# Altium footprint library Generic Footprint.PcbLib: 160 footprints (part 12 of 20) (continued)
## Symbol_CE-Logo-15x10mm_Silkscreen [mil] (continued)
1(453.22,392.68) 1(454.41,180.08) 1(455,96.81) 1(455,97.4) 1(455,97.99) 1(455,180.08) 1(455,321.22) 1(455,321.81) 1(455,322.4) 1(455,392.68) 1(455.59,25.94) 1(455.59,26.54) 1(455.59,322.99) 1(455.59,392.68) 1(455.59,393.27) 1(456.18,25.35) 1(456.18,322.99) 1(456.18,393.86) 1(456.18,394.45) 1(456.77,180.08) 1(456.77,322.99) 1(456.77,323.58) 1(456.77,324.17) 1(457.36,324.76) 1(457.95,180.08) 1(458.54,95.63) 1(458.54,96.22) 1(459.13,24.17) 1(459.13,24.76) 1(459.13,95.04) 1(459.13,395.04) 1(459.72,395.63) 1(459.72,396.22) 1(460.31,23.58) 1(460.31,94.45) 1(460.31,325.35) 1(460.9,93.27) 1(460.9,93.86) 1(460.9,325.94) 1(460.9,326.54) 1(461.49,22.99) 1(462.08,22.99) 1(462.67,22.99) 1(462.67,90.91) 1(462.67,91.5) 1(462.67,92.09) 1(462.67,92.68) 1(462.67,327.13) 1(462.67,327.72) 1(462.67,328.31) 1(463.26,22.4) 1(463.26,328.9) 1(463.26,396.81) 1(463.26,397.4) 1(463.85,21.81) 1(463.85,328.9) 1(463.85,397.99) 1(464.44,328.9) 1(464.44,329.49) 1(464.44,330.08) 1(465.04,21.22) 1(465.04,330.67) 1(465.63,330.67) 1(466.22,89.72) 1(466.22,90.31) 1(466.81,89.13) 1(466.81,398.58) 1(467.4,399.17) 1(467.99,330.67) 1(467.99,331.85) 1(467.99,399.76) 1(467.99,400.35) 1(468.58,19.45) 1(468.58,20.04) 1(468.58,20.63) 1(468.58,87.36) 1(468.58,87.95) 1(468.58,88.54) 1(468.58,331.26) 1(468.58,332.44) 1(468.58,400.35) 1(469.17,19.45) 1(469.17,332.44) 1(469.76,19.45) 1(470.35,332.44) 1(470.35,333.03) 1(470.35,333.62) 1(470.35,334.21) 1(471.53,86.77) 1(472.12,85.59) 1(472.12,86.18) 1(472.12,400.35) 1(472.71,18.27) 1(472.71,18.86) 1(472.71,400.94) 1(472.71,401.54) 1(473.3,17.68) 1(473.89,334.8) 1(473.89,335.39) 1(473.89,335.98) 1(473.89,402.13) 1(474.48,85) 1(475.67,84.41) 1(476.26,83.82) 1(476.85,83.23) 1(476.85,402.72) 1(476.85,403.31) 1(477.44,83.23) 1(477.44,336.57) 1(478.03,17.09) 1(478.03,81.46) 1(478.03,82.05) 1(478.03,82.64) 1(478.03,83.23) 1(478.03,337.17) 1(478.03,337.76) 1(478.03,338.35) 1(478.03,403.9) 1(478.62,15.91) 1(478.62,16.5) 1(478.62,338.35) 1(479.8,338.35) 1(481.57,79.68) 1(481.57,80.28) 1(481.57,80.87) 1(481.57,338.94) 1(481.57,339.53) 1(482.16,404.49) 1(482.16,405.08) 1(482.75,340.12) 1(482.75,405.67) 1(483.93,14.13) 1(483.93,14.72) 1(483.93,15.31) 1(484.52,340.71) 1(485.7,13.54) 1(485.7,77.91) 1(485.7,78.5) 1(485.7,79.09) 1(485.7,341.3) 1(486.29,341.89) 1(487.48,406.26) 1(487.48,406.85) 1(488.07,77.32) 1(488.66,77.32) 1(488.66,180.08) 1(488.66,407.44) 1(489.25,76.14) 1(489.25,76.73) 1(489.25,77.32) 1(489.25,180.08) 1(489.25,342.48) 1(489.25,343.07) 1(489.84,12.36) 1(489.84,12.95) 1(489.84,343.66) 1(491.61,180.08) 1(492.2,11.77) 1(492.2,180.08) 1(492.79,344.25) 1(492.79,344.84) 1(492.79,345.43) 1(492.79,408.03) 1(493.38,75.55) 1(493.38,408.03) 1(494.56,74.96) 1(495.15,11.18) 1(495.15,73.78) 1(495.15,74.37) 1(495.15,408.03) 1(495.15,408.62) 1(495.15,409.21) 1(495.74,10.59) 1(495.74,346.02) 1(496.33,73.78) 1(496.33,180.08) 1(496.33,346.02) 1(496.92,180.08) 1(497.52,10) 1(497.52,73.78) 1(497.52,346.02) 1(498.11,10) 1(498.11,409.8) 1(498.7,346.61) 1(499.29,10) 1(499.29,73.19) 1(499.29,347.2) 1(500.47,72.01) 1(500.47,72.6) 1(501.06,410.39) 1(501.65,347.8) 1(502.83,9.41) 1(503.42,8.82) 1(503.42,410.98) 1(504.01,71.42) 1(504.01,348.39) 1(504.6,348.98) 1(504.6,411.57) 1(506.37,8.23) 1(506.37,70.24) 1(506.37,70.83) 1(506.37,349.57) 1(509.33,350.16) 1(509.92,350.75) 1(510.51,351.34) 1(510.51,412.17) 1(511.1,69.65) 1(511.1,351.34) 1(511.1,412.76) 1(511.69,351.34) 1(512.28,7.05) 1(512.28,7.64) 1(512.28,68.46) 1(512.28,69.06) 1(513.46,413.35) 1(514.05,5.87) 1(514.05,6.46) 1(514.64,5.87) 1(514.64,6.46) 1(515.23,5.87) 1(515.23,6.46) 1(516.41,5.87) 1(516.41,351.93) 1(517,351.34) 1(517,351.93) 1(517.59,351.34) 1(517.59,351.93) 1(517.59,352.52) 1(517.59,353.11) 1(518.78,67.87) 1(519.37,5.87) 1(520.55,67.28) 1(521.73,5.28) 1(521.73,66.1) 1(521.73,66.69) 1(521.73,413.94) 1(521.73,414.53) 1(521.73,415.12) 1(522.32,5.28) 1(522.91,4.68) 1(522.91,5.28) 1(522.91,415.12) 1(523.5,4.68) 1(523.5,5.28) 1(523.5,5.87) 1(524.09,5.87) 1(524.09,66.1) 1(524.09,353.7) 1(524.68,5.87) 1(524.68,66.1) 1(524.68,415.12) 1(525.27,5.87) 1(525.27,66.1) 1(526.45,66.1) 1(527.04,66.1) 1(527.04,233.82) 1(527.04,235) 1(527.63,5.28) 1(528.22,66.1) 1(528.22,180.67) 1(528.22,181.26) 1(528.22,181.85) 1(528.22,182.44) 1(528.22,183.03) 1(528.22,183.62) 1(528.22,184.21) 1(528.22,184.8) 1(528.22,185.39) 1(528.22,185.98) 1(528.22,186.57) 1(528.22,187.17) 1(528.22,187.76) 1(528.22,188.35) 1(528.22,188.94) 1(528.22,189.53) 1(528.22,190.12) 1(528.22,190.71) 1(528.22,191.3) 1(528.22,191.89) 1(528.22,192.48) 1(528.22,193.07) 1(528.22,193.66) 1(528.22,194.25) 1(528.22,194.84) 1(528.22,195.43) 1(528.22,196.02) 1(528.22,196.61) 1(528.22,197.2) 1(528.22,197.8) 1(528.22,198.39) 1(528.22,198.98) 1(528.22,199.57) 1(528.22,200.16) 1(528.22,200.75) 1(528.22,201.34) 1(528.22,201.93) 1(528.22,202.52) 1(528.22,203.11) 1(528.22,203.7) 1(528.22,204.29) 1(528.22,204.88) 1(528.22,205.47) 1(528.22,206.06) 1(528.22,206.65) 1(528.22,207.24) 1(528.22,207.83) 1(528.22,208.43) 1(528.22,209.02) 1(528.22,209.61) 1(528.22,210.2) 1(528.22,210.79) 1(528.22,211.38) 1(528.22,211.97) 1(528.22,212.56) 1(528.22,213.15) 1(528.22,213.74) 1(528.22,214.33) 1(528.22,214.92) 1(528.22,215.51) 1(528.22,216.1) 1(528.22,216.69) 1(528.22,217.28) 1(528.22,217.87) 1(528.22,218.46) 1(528.22,219.06) 1(528.22,219.65) 1(528.22,220.24) 1(528.22,220.83) 1(528.22,221.42) 1(528.22,222.01) 1(528.22,222.6) 1(528.22,223.19) 1(528.22,223.78) 1(528.22,224.37) 1(528.22,224.96) 1(528.22,225.55) 1(528.22,226.14) 1(528.22,226.73) 1(528.22,227.32) 1(528.22,227.91) 1(528.22,228.5) 1(528.22,229.09) 1(528.22,229.69) 1(528.22,230.28) 1(528.22,230.87) 1(528.22,231.46) 1(528.22,232.05) 1(528.22,232.64) 1(528.22,233.23) 1(528.22,234.41) 1(528.22,235.59) 1(528.22,236.18) 1(528.22,236.77) 1(528.22,237.36) 1(528.22,237.95) 1(528.22,238.54) 1(528.22,239.13) 1(528.22,239.72) 1(528.22,240.31) 1(528.81,354.29) 1(529.41,354.88) 1(531.18,66.1) 1(531.18,355.47) 1(531.77,355.47) 1(532.95,4.68) 1(532.95,65.51) 1(532.95,66.1) 1(534.72,415.71) 1(536.49,4.09) 1(536.49,64.92) 1(537.08,64.33) 1(537.08,415.71) 1(537.67,4.09) 1(537.67,355.47) 1(538.26,4.09) 1(538.26,355.47) 1(538.85,354.88) 1(539.44,415.71) 1(540.04,415.71) 1(540.63,4.09) 1(540.63,354.88) 1(540.63,415.71) 1(541.22,4.09) 1(541.22,355.47) 1(541.81,4.09) 1(542.4,4.09) 1(542.4,64.33) 1(542.99,3.5) 1(543.58,3.5) 1(543.58,415.71) 1(545.35,415.71) 1(546.53,415.71) 1(548.3,415.71) 1(551.85,416.3) 1(553.03,3.5) 1(553.62,3.5) 1(553.62,416.3) 1(554.21,4.09) 1(554.21,415.71) 1(554.8,4.09) 1(554.8,415.71) 1(555.39,415.71) 1(555.98,415.71) 1(557.16,355.47) 1(557.75,64.33) 1(557.75,354.88) 1(559.52,64.33) 1(560.11,4.09) 1(560.11,64.92) 1(560.11,354.88) 1(560.11,355.47) 1(560.7,355.47) 1(561.29,415.71) 1(561.89,4.09) 1(562.48,4.09) 1(563.07,415.71) 1(563.66,65.51) 1(563.66,66.1) 1(563.66,415.71) 1(565.43,66.1) 1(566.02,4.68) 1(568.38,5.28) 1(568.38,5.87) 1(568.38,6.46) 1(568.38,7.05) 1(568.38,7.64) 1(568.38,8.23) 1(568.38,8.82) 1(568.38,9.41) 1(568.38,10) 1(568.38,10.59) 1(568.38,11.18) 1(568.38,11.77) 1(568.38,12.36) 1(568.38,12.95) 1(568.38,13.54) 1(568.38,14.13) 1(568.38,14.72) 1(568.38,15.31) 1(568.38,15.91) 1(568.38,16.5) 1(568.38,17.09) 1(568.38,17.68) 1(568.38,18.27) 1(568.38,18.86) 1(568.38,19.45) 1(568.38,20.04) 1(568.38,20.63) 1(568.38,21.22) 1(568.38,21.81) 1(568.38,22.4) 1(568.38,22.99) 1(568.38,23.58) 1(568.38,24.17) 1(568.38,24.76) 1(568.38,25.35) 1(568.38,25.94) 1(568.38,26.54) 1(568.38,27.13) 1(568.38,27.72) 1(568.38,28.31) 1(568.38,28.9) 1(568.38,29.49) 1(568.38,30.08) 1(568.38,30.67) 1(568.38,31.26) 1(568.38,31.85) 1(568.38,32.44) 1(568.38,33.03) 1(568.38,33.62) 1(568.38,34.21) 1(568.38,34.8) 1(568.38,35.98) 1(568.38,36.57) 1(568.38,37.17) 1(568.38,38.35) 1(568.38,38.94) 1(568.38,39.53) 1(568.38,40.12) 1(568.38,40.71) 1(568.38,41.3) 1(568.38,42.48) 1(568.38,43.07) 1(568.38,43.66) 1(568.38,44.25) 1(568.38,44.84) 1(568.38,45.43) 1(568.38,46.02) 1(568.38,46.61) 1(568.38,47.2) 1(568.38,47.8) 1(568.38,48.39) 1(568.38,48.98) 1(568.38,49.57) 1(568.38,50.16) 1(568.38,50.75) 1(568.38,51.34) 1(568.38,51.93) 1(568.38,52.52) 1(568.38,53.11) 1(568.38,53.7) 1(568.38,54.29) 1(568.38,54.88) 1(568.38,55.47) 1(568.38,56.06) 1(568.38,56.65) 1(568.38,57.24) 1(568.38,57.83) 1(568.38,58.43) 1(568.38,59.02) 1(568.38,59.61) 1(568.38,60.2) 1(568.38,60.79) 1(568.38,61.38) 1(568.38,61.97) 1(568.38,62.56) 1(568.38,63.15) 1(568.38,63.74) 1(568.38,64.33) 1(568.38,64.92) 1(568.38,65.51) 1(568.97,35.39) 1(568.97,37.76) 1(568.97,41.89) 1(568.97,355.47) 1(568.97,356.65) 1(568.97,357.24) 1(568.97,357.83) 1(568.97,359.02) 1(568.97,359.61) 1(568.97,360.2) 1(568.97,360.79) 1(568.97,361.38) 1(568.97,361.97) 1(568.97,362.56) 1(568.97,363.15) 1(568.97,363.74) 1(568.97,364.33) 1(568.97,364.92) 1(568.97,365.51) 1(568.97,366.1) 1(568.97,366.69) 1(568.97,367.28) 1(568.97,367.87) 1(568.97,368.46) 1(568.97,369.06) 1(568.97,369.65) 1(568.97,370.24) 1(568.97,370.83) 1(568.97,371.42) 1(568.97,372.01) 1(568.97,372.6) 1(568.97,373.19) 1(568.97,373.78) 1(568.97,374.37) 1(568.97,374.96) 1(568.97,375.55) 1(568.97,376.14) 1(568.97,377.32) 1(568.97,377.91) 1(568.97,378.5) 1(568.97,379.09) 1(568.97,379.69) 1(568.97,380.28) 1(568.97,380.87) 1(568.97,382.05) 1(568.97,382.64) 1(568.97,383.23) 1(568.97,384.41) 1(568.97,385) 1(568.97,385.59) 1(568.97,386.18) 1(568.97,387.36) 1(568.97,387.95) 1(568.97,388.54) 1(568.97,389.13) 1(568.97,389.72) 1(568.97,390.32) 1(568.97,390.91) 1(568.97,392.09) 1(568.97,392.68) 1(568.97,393.27) 1(568.97,393.86) 1(568.97,394.45) 1(568.97,395.04) 1(568.97,395.63) 1(568.97,396.22) 1(568.97,396.81) 1(568.97,397.4) 1(568.97,397.99) 1(568.97,399.17) 1(568.97,399.76) 1(568.97,400.35) 1(568.97,401.54) 1(568.97,402.13) 1(568.97,402.72) 1(568.97,403.31) 1(568.97,403.9) 1(568.97,404.49) 1(568.97,405.08) 1(568.97,406.26) 1(568.97,406.85) 1(568.97,407.44) 1(568.97,408.03) 1(568.97,409.21) 1(568.97,409.8) 1(568.97,410.39) 1(568.97,410.98) 1(568.97,412.17) 1(568.97,412.76) 1(568.97,413.35) 1(568.97,413.94) 1(568.97,414.53) 1(568.97,415.12) 1(569.56,356.06) 1(569.56,358.43) 1(569.56,376.73) 1(569.56,381.46) 1(569.56,383.82) 1(569.56,386.77) 1(569.56,391.5) 1(569.56,398.58) 1(569.56,400.94) 1(569.56,405.67) 1(569.56,408.62) 1(569.56,411.57)
Top Overlay:
  drawing of 1554 lines, arcs and shapes, not listed